# Altium footprint library Custom1.PcbLib: 554 footprints (part 35 of 35)
Each footprint in its own frame and in the unit in brackets; x right, y up, seen from the top. Pads: shape width x height; smd on the part's side, far side on the other; paste and mask are expansions set on the pad; w line width, h text height; cw(c..) or ccw(c..) is an arc to the next point about the centre after c.
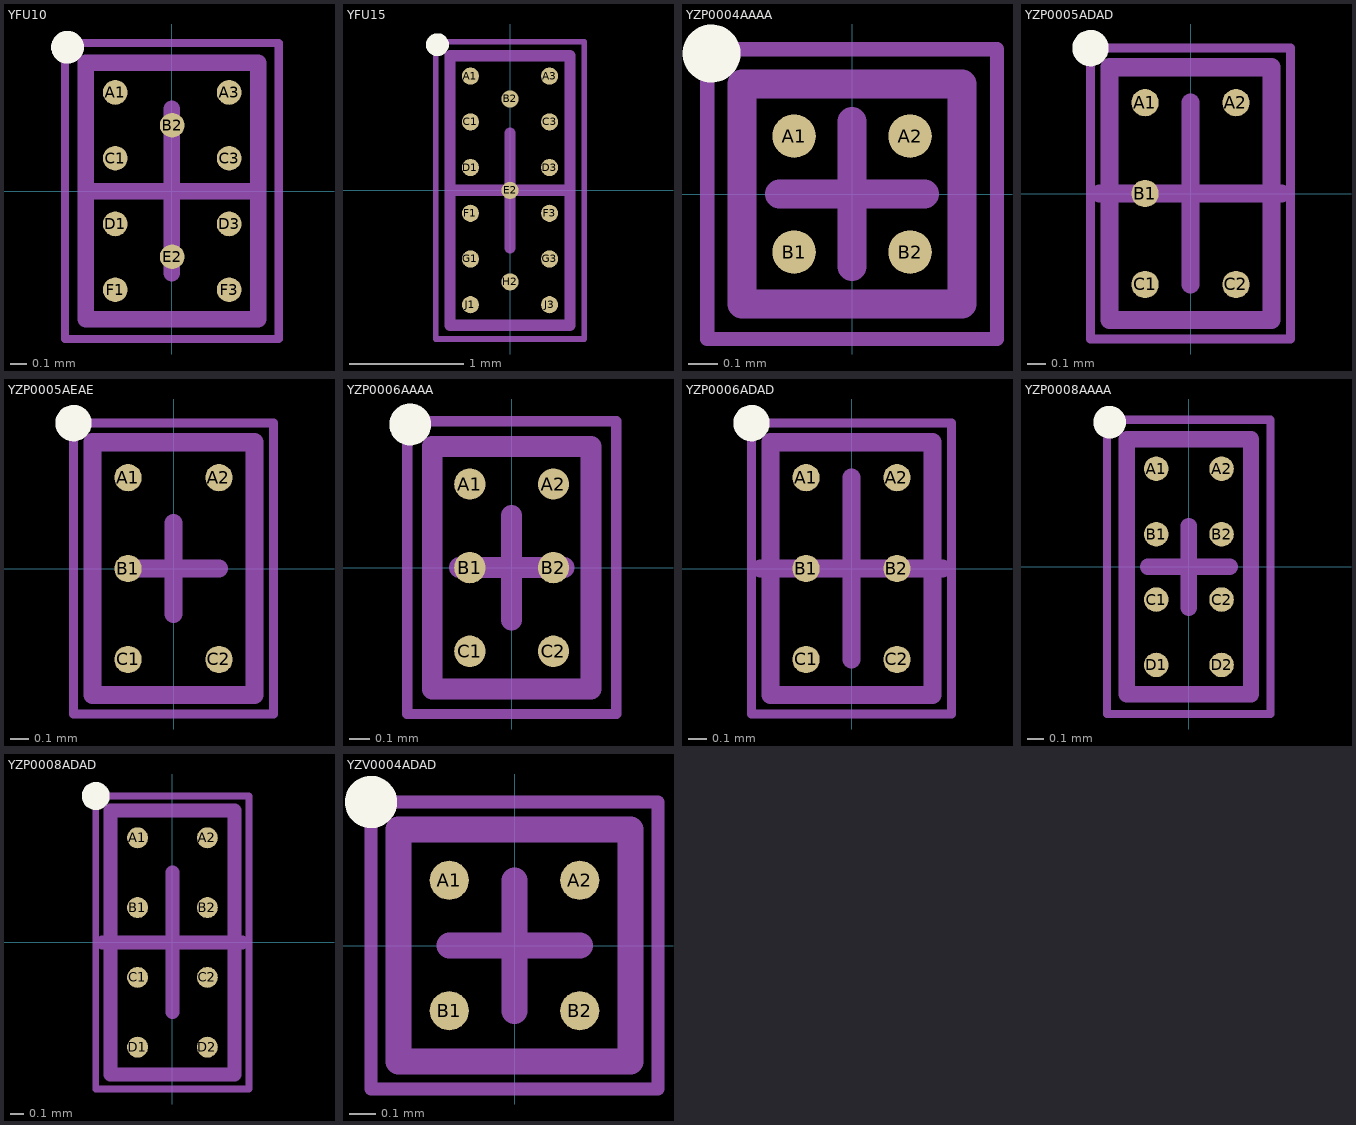
[diagram p34: the footprints below, top view; thin cyan lines are the x and y axes]

## YFU10 [mm] "BGA, Staggered, 10-Leads, Body 1.56x1.05mm, Pitch 0.693/0.4 mm"
height 0.32
pads (10):
  round 0.15 smd: A1(-0.345,0.6) A3(0.348,0.6) B2(0.001,0.4) C1(-0.345,0.2) C3(0.348,0.2) D1(-0.345,-0.2) D3(0.348,-0.2) E2(0.001,-0.4) F1(-0.345,-0.6) F3(0.348,-0.6)
Top Overlay:
  circle w0.1: c-0.635,0.875 r0.05
Mechanical 13:
  lines w0.1: -0.525,-0.78 0.525,-0.78 0.525,0.78 -0.525,0.78 -0.525,-0.78
Mechanical 15:
  lines w0.05: -0.65,-0.9 0.65,-0.9 0.65,0.9 -0.65,0.9 -0.65,-0.9
  lines w0.1: -0.5,0 0.5,0 ; 0,-0.5 0,0.5
3D body: height 0.32, standoff 0.12, extent -0.525,-0.78 0.525,0.78

## YFU15 [mm] "BGA, Staggered, 15-Leads, Body 2.36x1.05mm, Pitch 0.693/0.4mm"
height 0.32
pads (15):
  round 0.15 smd: A1(-0.346,1) A3(0.346,1) B2(0,0.8) C1(-0.346,0.6) C3(0.346,0.6) D1(-0.346,0.2) D3(0.346,0.2) E2(0,0) F1(-0.346,-0.2) F3(0.346,-0.2) G1(-0.346,-0.6) G3(0.346,-0.6) H2(0,-0.8) J1(-0.346,-1) J3(0.346,-1)
Top Overlay:
  circle w0.1: c-0.635,1.275 r0.05
Mechanical 13:
  lines w0.1: -0.525,-1.18 0.525,-1.18 0.525,1.18 -0.525,1.18 -0.525,-1.18
Mechanical 15:
  lines w0.05: -0.65,-1.3 0.65,-1.3 0.65,1.3 -0.65,1.3 -0.65,-1.3
  lines w0.1: -0.5,0 0.5,0 ; 0,-0.5 0,0.5
3D body: height 0.32, standoff 0.12, extent -0.525,-1.18 0.525,1.18

## YZP0004AAAA [mm] "BGA, 4-Balls, Body 0.76x0.76mm, Pitch 0.4mm"
height 0.5
pads (4):
  round 0.15 smd: A1(-0.2,0.2) A2(0.2,0.2) B1(-0.2,-0.2) B2(0.2,-0.2)
Top Overlay:
  circle w0.1: c-0.485,0.485 r0.05
Mechanical 13:
  lines w0.1: -0.38,-0.38 0.38,-0.38 0.38,0.38 -0.38,0.38 -0.38,-0.38
Mechanical 15:
  lines w0.05: -0.5,-0.5 0.5,-0.5 0.5,0.5 -0.5,0.5 -0.5,-0.5
  lines w0.1: -0.25,0 0.25,0 ; 0,-0.25 0,0.25
3D body: height 0.5, standoff 0.13, extent -0.38,-0.38 0.38,0.38

## YZP0005ADAD [mm] "BGA, 5-Balls, Body 1.39x0.89mm, Pitch 0.5mm"
height 0.5
pads (5):
  round 0.15 smd: A1(-0.25,0.5) A2(0.25,0.5) B1(-0.25,0) C1(-0.25,-0.5) C2(0.25,-0.5)
Top Overlay:
  circle w0.1: c-0.55,0.8 r0.05
Mechanical 13:
  lines w0.1: -0.445,-0.695 -0.445,0.695 0.445,0.695 0.445,-0.695 -0.445,-0.695
Mechanical 15:
  lines w0.05: -0.55,-0.8 -0.55,0.8 0.55,0.8 0.55,-0.8 -0.55,-0.8
  lines w0.1: -0.5,0 0.5,0 ; 0,-0.5 0,0.5
3D body: height 0.5, standoff 0.15, extent -0.445,-0.695 0.445,0.695

## YZP0005AEAE [mm] "BGA, 5-Balls, Body 1.39x0.89mm, Pitch 0.5mm"
height 0.5
pads (5):
  round 0.15 smd: A1(-0.25,0.5) A2(0.25,0.5) B1(-0.25,0) C1(-0.25,-0.5) C2(0.25,-0.5)
Top Overlay:
  circle w0.1: c-0.55,0.8 r0.05
Mechanical 13:
  lines w0.1: -0.445,-0.695 -0.445,0.695 0.445,0.695 0.445,-0.695 -0.445,-0.695
Mechanical 15:
  lines w0.05: -0.55,-0.8 -0.55,0.8 0.55,0.8 0.55,-0.8 -0.55,-0.8
  lines w0.1: -0.25,0 0.25,0 ; 0,-0.25 0,0.25
3D body: height 0.5, standoff 0.15, extent -0.445,-0.695 0.445,0.695

## YZP0006AAAA [mm] "BGA, 6-Balls, Body 1.16x0.76mm, Pitch 0.4mm"
height 0.5
pads (6):
  round 0.15 smd: A1(-0.2,0.4) A2(0.2,0.4) B1(-0.2,0) B2(0.2,0) C1(-0.2,-0.4) C2(0.2,-0.4)
Top Overlay:
  circle w0.1: c-0.485,0.685 r0.05
Mechanical 13:
  lines w0.1: -0.38,-0.58 -0.38,0.58 0.38,0.58 0.38,-0.58 -0.38,-0.58
Mechanical 15:
  lines w0.05: -0.5,-0.7 -0.5,0.7 0.5,0.7 0.5,-0.7 -0.5,-0.7
  lines w0.1: -0.25,0 0.25,0 ; 0,-0.25 0,0.25
3D body: height 0.5, standoff 0.13, extent -0.38,-0.58 0.38,0.58

## YZP0006ADAD [mm] "BGA, 6-Balls, Body 1.39x0.89mm, Pitch 0.5mm"
height 0.5
pads (6):
  round 0.15 smd: A1(-0.25,0.5) A2(0.25,0.5) B1(-0.25,0) B2(0.25,0) C1(-0.25,-0.5) C2(0.25,-0.5)
Top Overlay:
  circle w0.1: c-0.55,0.8 r0.05
Mechanical 13:
  lines w0.1: -0.445,-0.695 -0.445,0.695 0.445,0.695 0.445,-0.695 -0.445,-0.695
Mechanical 15:
  lines w0.05: -0.55,-0.8 -0.55,0.8 0.55,0.8 0.55,-0.8 -0.55,-0.8
  lines w0.1: -0.5,0 0.5,0 ; 0,-0.5 0,0.5
3D body: height 0.5, standoff 0.15, extent -0.445,-0.695 0.445,0.695

## YZP0008AAAA [mm] "BGA, 8-Balls, Body 1.56x0.76mm, Pitch 0.4mm"
height 0.5
pads (8):
  round 0.15 smd: A1(-0.2,0.6) A2(0.2,0.6) B1(-0.2,0.2) B2(0.2,0.2) C1(-0.2,-0.2) C2(0.2,-0.2) D1(-0.2,-0.6) D2(0.2,-0.6)
Top Overlay:
  circle w0.1: c-0.485,0.885 r0.05
Mechanical 13:
  lines w0.1: -0.38,-0.78 -0.38,0.78 0.38,0.78 0.38,-0.78 -0.38,-0.78
Mechanical 15:
  lines w0.05: -0.5,-0.9 -0.5,0.9 0.5,0.9 0.5,-0.9 -0.5,-0.9
  lines w0.1: -0.25,0 0.25,0 ; 0,-0.25 0,0.25
3D body: height 0.5, standoff 0.13, extent -0.38,-0.78 0.38,0.78

## YZP0008ADAD [mm] "BGA, 8-Balls, Body 1.89x0.89mm, Pitch 0.5mm"
height 0.5
pads (8):
  round 0.15 smd: A1(-0.25,0.75) A2(0.25,0.75) B1(-0.25,0.25) B2(0.25,0.25) C1(-0.25,-0.25) C2(0.25,-0.25) D1(-0.25,-0.75) D2(0.25,-0.75)
Top Overlay:
  circle w0.1: c-0.55,1.05 r0.05
Mechanical 13:
  lines w0.1: -0.445,-0.945 -0.445,0.945 0.445,0.945 0.445,-0.945 -0.445,-0.945
Mechanical 15:
  lines w0.05: -0.55,-1.05 -0.55,1.05 0.55,1.05 0.55,-1.05 -0.55,-1.05
  lines w0.1: -0.5,0 0.5,0 ; 0,-0.5 0,0.5
3D body: height 0.5, standoff 0.15, extent -0.445,-0.945 0.445,0.945

## YZV0004ADAD [mm] "BGA, 4-Balls, Body 0.89x0.89mm, Pitch 0.5mm"
height 0.5
pads (4):
  round 0.15 smd: A1(-0.25,0.25) A2(0.25,0.25) B1(-0.25,-0.25) B2(0.25,-0.25)
Top Overlay:
  circle w0.1: c-0.55,0.55 r0.05
Mechanical 13:
  lines w0.1: -0.445,-0.445 -0.445,0.445 0.445,0.445 0.445,-0.445 -0.445,-0.445
Mechanical 15:
  lines w0.05: -0.55,-0.55 -0.55,0.55 0.55,0.55 0.55,-0.55 -0.55,-0.55
  lines w0.1: -0.25,0 0.25,0 ; 0,-0.25 0,0.25
3D body: height 0.5, standoff 0.15, extent -0.445,-0.445 0.445,0.445